# Altium footprint library custom_parts_old.PcbLib: 27 footprints (part 1 of 2)
Each footprint in its own frame and in the unit in brackets; x right, y up, seen from the top. Pads: shape width x height; smd on the part's side, far side on the other; paste and mask are expansions set on the pad; w line width, h text height; cw(c..) or ccw(c..) is an arc to the next point about the centre after c.
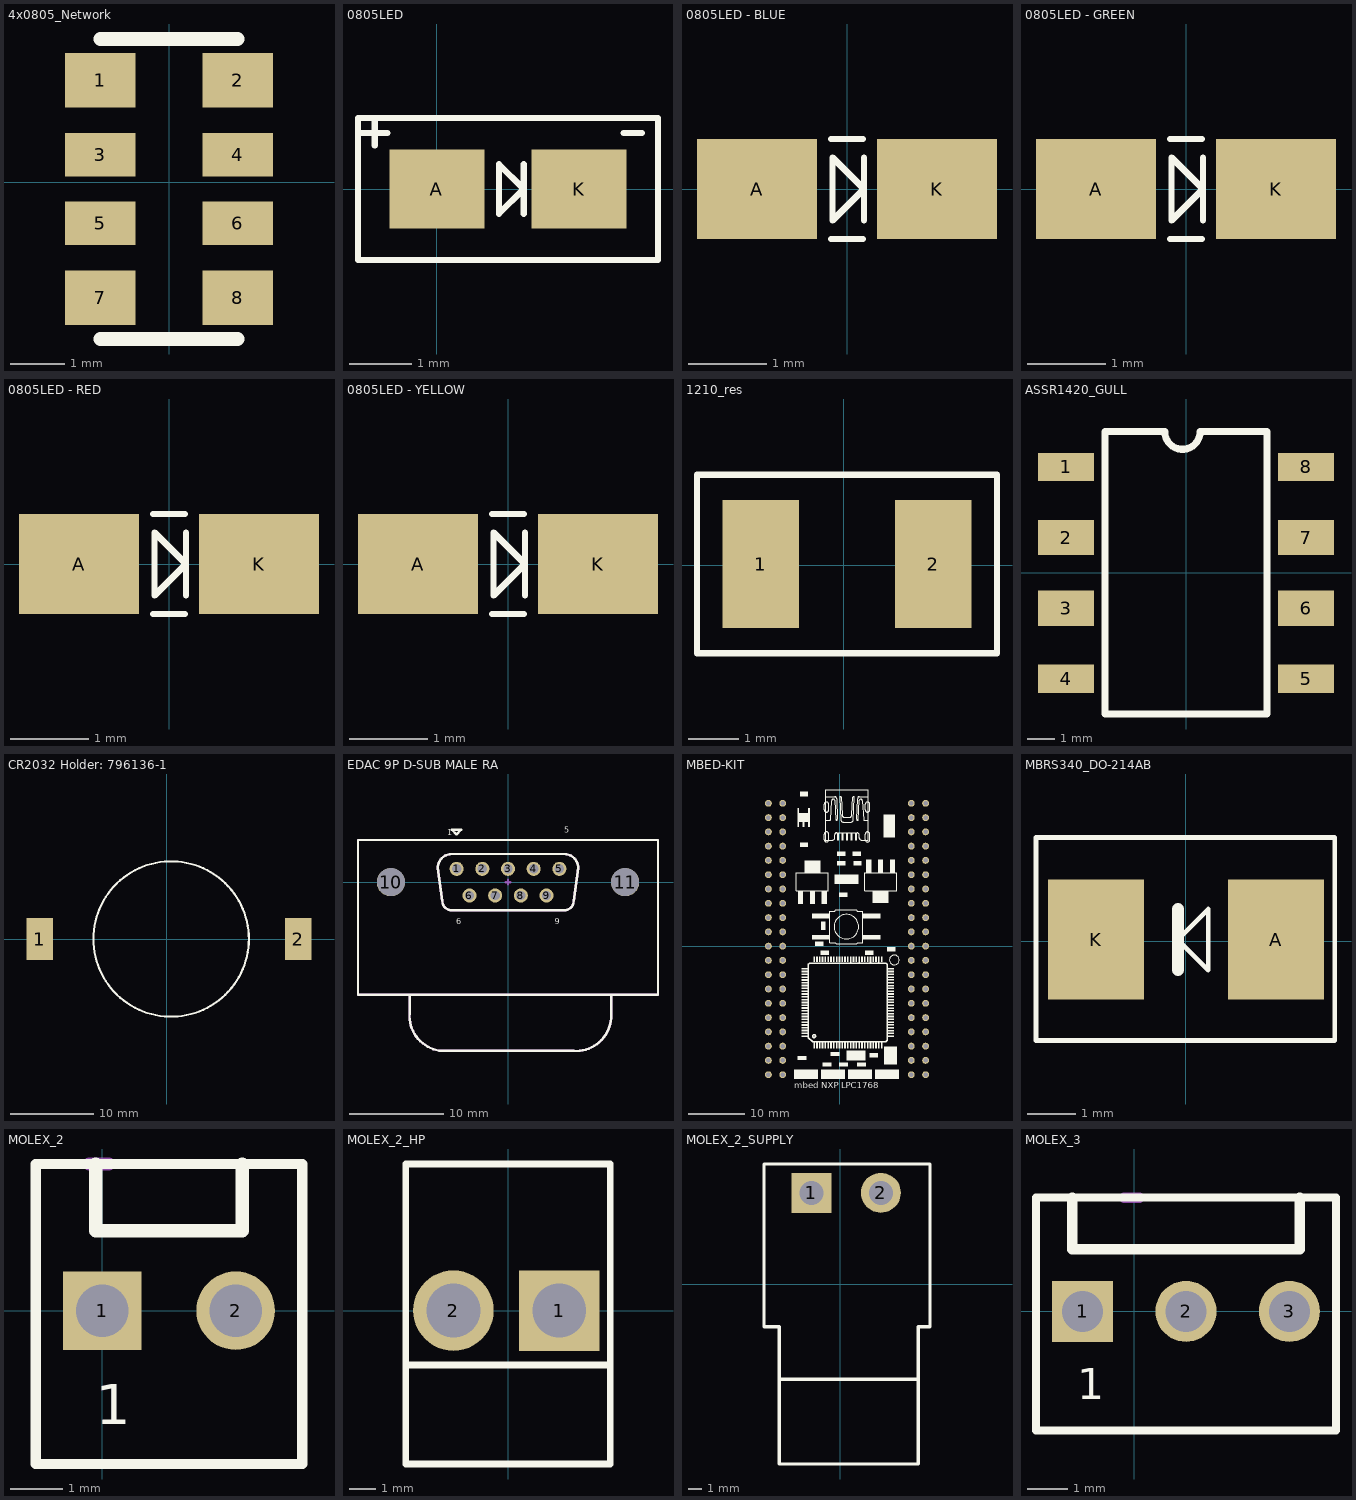
[diagram p0: the footprints below, top view; thin cyan lines are the x and y axes]

## 4x0805_Network [mm]
pads (8):
  rect 1.3x1 smd: 1(-1.27,1.88) 2(1.27,1.88) 7(-1.27,-2.134) 8(1.27,-2.134)
  rect 1.3x0.8 smd: 3(-1.27,0.508) 4(1.27,0.508) 5(-1.27,-0.762) 6(1.27,-0.762)
Top Overlay:
  lines w0.254: -1.27,-2.896 1.27,-2.896 ; -1.27,2.642 1.27,2.642
3D body: height 0.55, standoff 0, extent -1.524,-2.743 1.524,2.489

## 0805LED [mil]
pads (2):
  rect 60x50 smd: A(0,0) K(90,0)
Top Overlay:
  lines w4: -50,35.43 -31.5,35.43 ; -39.37,27.56 -39.37,43.31 ; 55,-15.75 55,15.75 ; 118.11,35.43 129.92,35.43 ; -50,-45 140,-45 140,45 -50,45 -50,-45 ; 39.25,-15.75 55,0 39.25,15.75 39.25,-15.75
3D body: height 5.91, standoff 0, extent 0,-25 86,25
3D body: height 23.62, standoff 6.3, extent 12,-25 73,25

## 0805LED - BLUE [mil]
pads (2):
  rect 60x50 smd: A(-45,0) K(45,0)
Top Overlay:
  lines w3.15: -8,-25 8,-25 ; -8,25 8,25 ; 8.5,-15.75 8.5,15.75 ; -7.25,-15.75 8.5,0 -7.25,15.75 -7.25,-15.75
3D body: height 5.91, standoff 0, extent -45,-25 41,25
3D body: height 23.62, standoff 6.3, extent -33,-25 28,25

## 0805LED - GREEN [mil]
pads (2):
  rect 60x50 smd: A(-45,0) K(45,0)
Top Overlay:
  lines w3.15: -8,-25 8,-25 ; -8,25 8,25 ; 8.5,-15.75 8.5,15.75 ; -7.25,-15.75 -7.25,15.75 8.5,0 -7.25,-15.75
3D body: height 23.62, standoff 6.3, extent -33,-25 28,25
3D body: height 5.91, standoff 0, extent -45,-25 41,25

## 0805LED - RED [mil]
pads (2):
  rect 60x50 smd: A(-45,0) K(45,0)
Top Overlay:
  lines w3.15: -8,-25 8,-25 ; -8,25 8,25 ; 8.5,-15.75 8.5,15.75 ; -7.25,-15.75 -7.25,15.75 8.5,0 -7.25,-15.75
3D body: height 23.62, standoff 6.3, extent -33,-25 28,25
3D body: height 5.91, standoff 0, extent -45,-25 41,25

## 0805LED - YELLOW [mil]
pads (2):
  rect 60x50 smd: A(-45,0) K(45,0)
Top Overlay:
  lines w3.15: -8,-25 8,-25 ; -8,25 8,25 ; 8.5,-15.75 8.5,15.75 ; -7.25,-15.75 8.5,0 -7.25,15.75 -7.25,-15.75
3D body: height 5.91, standoff 0, extent -45,-25 41,25
3D body: height 23.62, standoff 6.3, extent -33,-25 28,25

## 1210_res [mil]
pads (2):
  rect 60x100 smd: 1(-65,1) 2(70,1)
Top Overlay:
  lines w5: -115,-69 -115,71 120,71 120,-69 -115,-69
3D body: height 46, standoff 0, extent 50,-49 80,51
3D body: height 45, standoff 0, extent -47,-48 51,50
3D body: height 46, standoff 0, extent -75,-49 -45,51

## ASSR1420_GULL [mil]
pads (8):
  rect 78.74x40 smd: 1(-170,150) 4(-170,-150) 5(170,-150) 8(170,150)
  rect 78.74x50 smd: 2(-170,50) 3(-170,-50) 6(170,-50) 7(170,50)
Top Overlay:
  lines w10: -115,-200 -115,200 -30,200 ccw(c-5,200) 20,200 115,200 115,-200 -115,-200
3D body "User Library-DIP08-300.step": height 200, standoff -98.03, extent -159.92,-214.96 149.93,214.96

## CR2032 Holder: 796136-1 [mm]
pads (2):
  rect 3.2x5 smd: 1(-15.24,0) 2(15.748,0)
Top Overlay:
  circle w0.254: c0.508,0 r9.323
3D body "c-0796136-01-c-3d.stp": height 6.52, standoff -0.01, extent -15.785,-9.525 16.536,9.525

## EDAC 9P D-SUB MALE RA [mm] "D-SUB- 9P, MALE, RT ANGLE, TH"
height 12
pads (11):
  round 1.5 hole 1 unplated: 1(-5.48,1.422) 2(-2.74,1.422) 3(0,1.422) 4(2.74,1.422) 5(5.48,1.422) 6(-4.108,-1.422) 7(-1.368,-1.422) 8(1.372,-1.422) 9(4.112,-1.422)
  round 3 hole 3 unplated: 10(-12.5,0) 11(12.5,0)
Top Overlay:
  lines w0.254: -10.5,-12 -10.5,-14 ccw(c-6.75,-14.25) -7,-18 7,-18 ccw(c7.25,-14.25) 11,-14.5 11,-12 ; -5.996,-3.004 cw(c-5.996,-2) -7,-2 -7.5,1.5 cw(c-6,1.5) -6,3 6,3 cw(c6,1.5) 7.5,1.5 7,-2 cw(c5.996,-2) 5.996,-3.004 ; -5.996,-3 6,-3 ; -5.5,5.1 -6,5.6 -5,5.6 -5.5,5.1 ; -5.5,5.1 -5.5,5.1 ; -16,-12 -16,0 -16,4.5 16,4.5 16,-12 -16,-12
  text "6" at -5.5,-4.5 h0.64
  text "9" at 5,-4.5 h0.64
  text "5" at 6,5.25 h0.64
  text "1" at -6.5,5 h0.64
Mechanical 15:
  lines w0.254: -10.5,-12 -10.5,-14 ccw(c-6.75,-14.25) -7,-18 7,-18 ccw(c7.25,-14.25) 11,-14.5 11,-12 ; -5.996,-3.004 cw(c-5.996,-2) -7,-2 -7.5,1.5 cw(c-6,1.5) -6,3 6,3 cw(c6,1.5) 7.5,1.5 7,-2 cw(c5.996,-2) 5.996,-3.004 ; -5.996,-3 6,-3 ; -0.25,0 0.25,0 ; 0,-0.25 0,0.25 ; -16,-12 16,-12 16,4.5 -16,4.5 -16,0 -16,-12
3D body "210112043.stp": height 13.2, standoff -3.6, extent -15.4,-17.5 15.4,4.2

## MBED-KIT [mil]
pads (80):
  round 48 hole 32: D+(500,100) D+(600,100) D-(500,200) D-(600,200) GND(-500,1000) GND(-400,1000) IF+(500,700) IF+(600,700) IF-(500,800) IF-(600,800) NR(-500,700) NR(-400,700) P$5(-500,600) P$5(-400,600) P$6(-500,500) P$6(-400,500) P$7(-500,400) P$7(-400,400) P$8(-500,300) P$8(-400,300) P$9(-500,200) P$9(-400,200) P$10(-500,100) P$10(-400,100) P$11(-500,0) P$11(-400,0) P$12(-500,-100) P$12(-400,-100) P$13(-500,-200) P$13(-400,-200) P$14(-500,-300) P$14(-400,-300) P$15(-500,-400) P$15(-400,-400) P$16(-500,-500) P$16(-400,-500) P$17(-500,-600) P$17(-400,-600) P$18(-500,-700) P$18(-400,-700) P$19(-500,-800) P$19(-400,-800) P$20(-500,-900) P$20(-400,-900) P$21(500,-900) P$21(600,-900) P$22(500,-800) P$22(600,-800) P$23(500,-700) P$23(600,-700) P$24(500,-600) P$24(600,-600) P$25(500,-500) P$25(600,-500) P$26(500,-400) P$26(600,-400) P$27(500,-300) P$27(600,-300) P$28(500,-200) P$28(600,-200) P$29(500,-100) P$29(600,-100) P$30(500,0) P$30(600,0) RD+(500,500) RD+(600,500) RD-(500,600) RD-(600,600) TD+(500,300) TD+(600,300) TD-(500,400) TD-(600,400) VB(-500,800) VB(-400,800) VIN(-500,900) VIN(-400,900) VOUT(500,1000) VOUT(600,1000) VU(500,900) VU(600,900)
Top Overlay:
  drawing of 249 lines, arcs and shapes, not listed
  text "mbed NXP LPC1768" at -320.08,-994.37 h42.5
Bottom Overlay:
  lines w5: -450,-1000 550,-1000 550,1100 -450,1100 -450,-1000
Mechanical 2:
  text ">NAME" at -450,1150 h77.5
3D body: height 334.65, standoff 11.81, extent -550,-950 -350,1050
3D body: height 334.65, standoff 11.81, extent 450,-950 650,1050
3D body "MBED.STEP": height 663.15, standoff 204.8, extent -457.81,-1015.17 565.81,1181

## MBRS340_DO-214AB [mm]
pads (2):
  rect 2x2.5 smd: A(1.876,0.034) K(-1.874,0.034)
Top Overlay:
  lines w0.102: -3.124,-2.066 3.101,-2.066 3.101,2.159 -3.124,2.159 -3.124,-2.066 ; -0.17,0.034 0.465,-0.601 0.465,0.034 0.465,0.669 -0.17,0.034
  lines w0.25: -0.17,-0.601 -0.17,0.034 -0.17,0.669
3D body: height 2, standoff 0.4, extent -2.299,-1.916 2.276,2.034
3D body: height 0.5, standoff 0, extent -0.499,-1.916 0.601,2.034
3D body: height 2.2, standoff 0.5, extent -2.299,-1.916 2.276,2.034
3D body: height 2.23, standoff 2.2, extent -1.637,-1.766 -1.174,1.859
3D body: height 0.3, standoff 0, extent 1.701,-1.091 2.676,1.159
3D body: height 1.1, standoff 0.7, extent 2.251,-1.091 2.676,1.159
3D body: height 1.1, standoff 0, extent 2.376,-1.091 2.676,1.159
3D body: height 1.1, standoff 0, extent -2.699,-1.091 -2.399,1.159
3D body: height 1.1, standoff 0.7, extent -2.699,-1.091 -2.274,1.159
3D body: height 0.3, standoff 0, extent -2.699,-1.091 -1.724,1.159

## MOLEX_2 [mm] "Connector; Header; 2 Position"
pads (2):
  rect 1.5x1.5 hole 1: 1(0,0)
  round 1.5 hole 1: 2(2.54,0)
Top Overlay:
  lines w0.2: -1.27,-2.921 -1.27,2.794 3.81,2.794 3.81,-2.921 -1.27,-2.921
  lines w0.254: -0.127,2.794 -0.127,1.524 2.667,1.524 2.667,2.794
  text "1" at -0.127,-2.159 h0.76
Mechanical 1:
  lines w0.254: -0.254,2.794 0.127,2.794
3D body "022272021.stp": height 11.64, standoff -3.62, extent -1.27,-2.879 3.81,2.921

## MOLEX_2_HP [mm]
pads (2):
  rect 3x3 hole 2: 1(1.905,0)
  round 3 hole 2: 2(-2.032,0)
Top Overlay:
  lines w0.254: -3.683,-2.032 3.683,-2.032 ; -3.81,-5.715 -3.81,5.461 3.81,5.461 3.81,2.603 3.81,-2.857 3.81,-5.715 -3.81,-5.715
3D body "009652028.stp": height 13.85, standoff -3.6, extent -3.453,-5.122 3.707,5.628

## MOLEX_2_SUPPLY [mm]
pads (2):
  rect 3x3 hole 1.8: 1(-2.159,6.858)
  round 3 hole 1.8: 2(3.048,6.858)
Top Overlay:
  lines w0.254: -4.445,-7.112 5.842,-7.112 ; -5.715,-3.175 -4.572,-3.175 -4.572,-13.462 5.842,-13.462 5.842,-3.175 6.731,-3.175 6.731,9.017 -5.715,9.017 -5.715,-3.175
3D body "395321002.stp": height 8.38, standoff -3.81, extent -5.575,-3.048 6.591,8.89
3D body "395300002.stp": height 14.98, standoff -0.01, extent -4.445,-13.335 5.715,4.953

## MOLEX_3 [mm] "Connector; Header; 2 Position"
pads (3):
  rect 1.5x1.5 hole 1: 1(-1.27,0)
  round 1.5 hole 1: 2(1.27,0) 3(3.81,0)
Top Overlay:
  lines w0.2: -2.413,-2.921 -2.413,2.794 4.953,2.794 4.953,-2.921 -2.413,-2.921
  lines w0.254: -1.524,2.794 -1.524,1.524 4.064,1.524 4.064,1.841 4.064,2.476 4.064,2.794
  text "1" at -1.397,-2.159 h0.76
Mechanical 1:
  lines w0.254: -0.254,2.794 0.127,2.794
3D body "022272031.stp": height 11.64, standoff -3.62, extent -2.54,-2.879 5.08,2.921